# Altium integrated library ALTIUM-PHD_2_54_SMT_PIN_HEADER_6100XX18X21.IntLib: 138 symbols
Pins are listed as number, name and electrical type; pins without a type are passive.

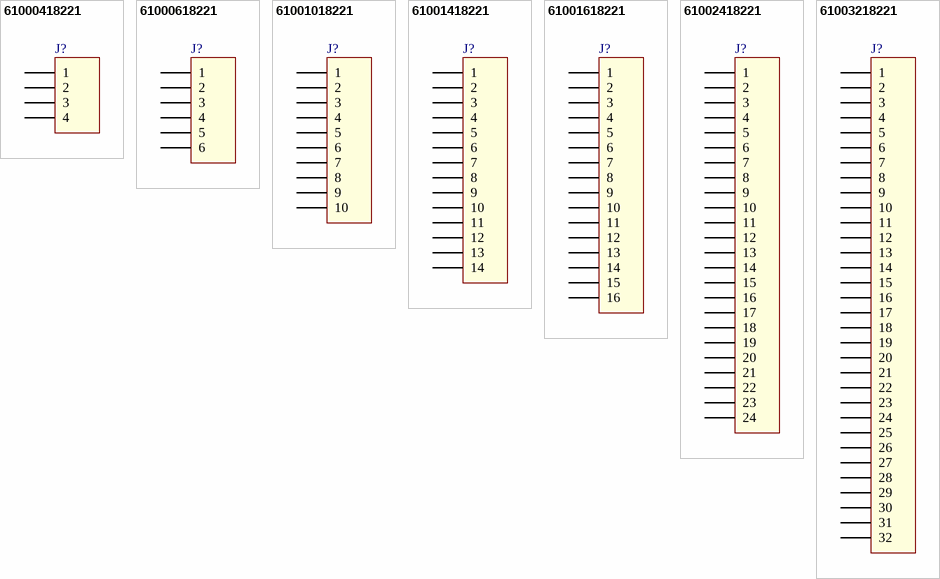
[diagram p0: symbols 61000418221 to 61003218221]

## 61000418221
designator J?
WR-PHD 2.54 mm SMT Pin Header, 4p; Part Number: 61000418221; Pin Number: 4; Rated Current: 3 A; Working Voltage: 250 VAC; Withstanding Voltage: 500 VAC; Pitch: 2.54 mm; ComponentLink1Description: Manufacturer; ComponentLink1URL: http://www.we-online.de; ComponentLink2Description: Datasheet; ComponentLink2URL: http://katalog.we-online.de/em/datasheet/6100xx18221%282%29.pdf; Published Date: Aug 2017; Publisher: Wurth Elektronik
footprint 61000418221
pins: 1, 2, 3, 4

## 61000618221
designator J?
WR-PHD 2.54 mm SMT Pin Header, 6p; Part Number: 61000618221; Pin Number: 6; Rated Current: 3 A; Working Voltage: 250 VAC; Withstanding Voltage: 500 VAC; Pitch: 2.54 mm; ComponentLink1Description: Manufacturer; ComponentLink1URL: http://www.we-online.de; ComponentLink2Description: Datasheet; ComponentLink2URL: http://katalog.we-online.de/em/datasheet/6100xx18221%282%29.pdf; Published Date: Aug 2017; Publisher: Wurth Elektronik
footprint 61000618221
pins: 1, 2, 3, 4, 5, 6

## 61001018221
designator J?
WR-PHD 2.54 mm SMT Pin Header, 10p; Part Number: 61001018221; Pin Number: 10; Rated Current: 3 A; Working Voltage: 250 VAC; Withstanding Voltage: 500 VAC; Pitch: 2.54 mm; ComponentLink1Description: Manufacturer; ComponentLink1URL: http://www.we-online.de; ComponentLink2Description: Datasheet; ComponentLink2URL: http://katalog.we-online.de/em/datasheet/6100xx18221%282%29.pdf; Published Date: Aug 2017; Publisher: Wurth Elektronik
footprint 61001018221
pins: 1, 2, 3, 4, 5, 6, 7, 8, 9, 10

## 61001418221
designator J?
WR-PHD 2.54 mm SMT Pin Header, 14p; Part Number: 61001418221; Pin Number: 14; Rated Current: 3 A; Working Voltage: 250 VAC; Withstanding Voltage: 500 VAC; Pitch: 2.54 mm; ComponentLink1Description: Manufacturer; ComponentLink1URL: http://www.we-online.de; ComponentLink2Description: Datasheet; ComponentLink2URL: http://katalog.we-online.de/em/datasheet/6100xx18221%282%29.pdf; Published Date: Aug 2017; Publisher: Wurth Elektronik
footprint 61001418221
pins: 1, 2, 3, 4, 5, 6, 7, 8, 9, 10, 11, 12, 13, 14

## 61001618221
designator J?
WR-PHD 2.54 mm SMT Pin Header, 16p; Part Number: 61001618221; Pin Number: 16; Rated Current: 3 A; Working Voltage: 250 VAC; Withstanding Voltage: 500 VAC; Pitch: 2.54 mm; ComponentLink1Description: Manufacturer; ComponentLink1URL: http://www.we-online.de; ComponentLink2Description: Datasheet; ComponentLink2URL: http://katalog.we-online.de/em/datasheet/6100xx18221%282%29.pdf; Published Date: Aug 2017; Publisher: Wurth Elektronik
footprint 61001618221
pins: 1, 2, 3, 4, 5, 6, 7, 8, 9, 10, 11, 12, 13, 14, 15, 16

## 61002418221
designator J?
WR-PHD 2.54 mm SMT Pin Header, 24p; Part Number: 61002418221; Pin Number: 24; Rated Current: 3 A; Working Voltage: 250 VAC; Withstanding Voltage: 500 VAC; Pitch: 2.54 mm; ComponentLink1Description: Manufacturer; ComponentLink1URL: http://www.we-online.de; ComponentLink2Description: Datasheet; ComponentLink2URL: http://katalog.we-online.de/em/datasheet/6100xx18221%282%29.pdf; Published Date: Aug 2017; Publisher: Wurth Elektronik
footprint 61002418221
pins: 1, 2, 3, 4, 5, 6, 7, 8, 9, 10, 11, 12, 13, 14, 15, 16, 17, 18, 19, 20, 21, 22, 23, 24

## 61003218221
designator J?
WR-PHD 2.54 mm SMT Pin Header, 32p; Part Number: 61003218221; Pin Number: 32; Rated Current: 3 A; Working Voltage: 250 VAC; Withstanding Voltage: 500 VAC; Pitch: 2.54 mm; ComponentLink1Description: Manufacturer; ComponentLink1URL: http://www.we-online.de; ComponentLink2Description: Datasheet; ComponentLink2URL: http://katalog.we-online.de/em/datasheet/6100xx18221%282%29.pdf; Published Date: Aug 2017; Publisher: Wurth Elektronik
footprint 61003218221
pins: 1, 2, 3, 4, 5, 6, 7, 8, 9, 10, 11, 12, 13, 14, 15, 16, 17, 18, 19, 20, 21, 22, 23, 24, 25, 26, 27, 28, 29, 30, 31, 32


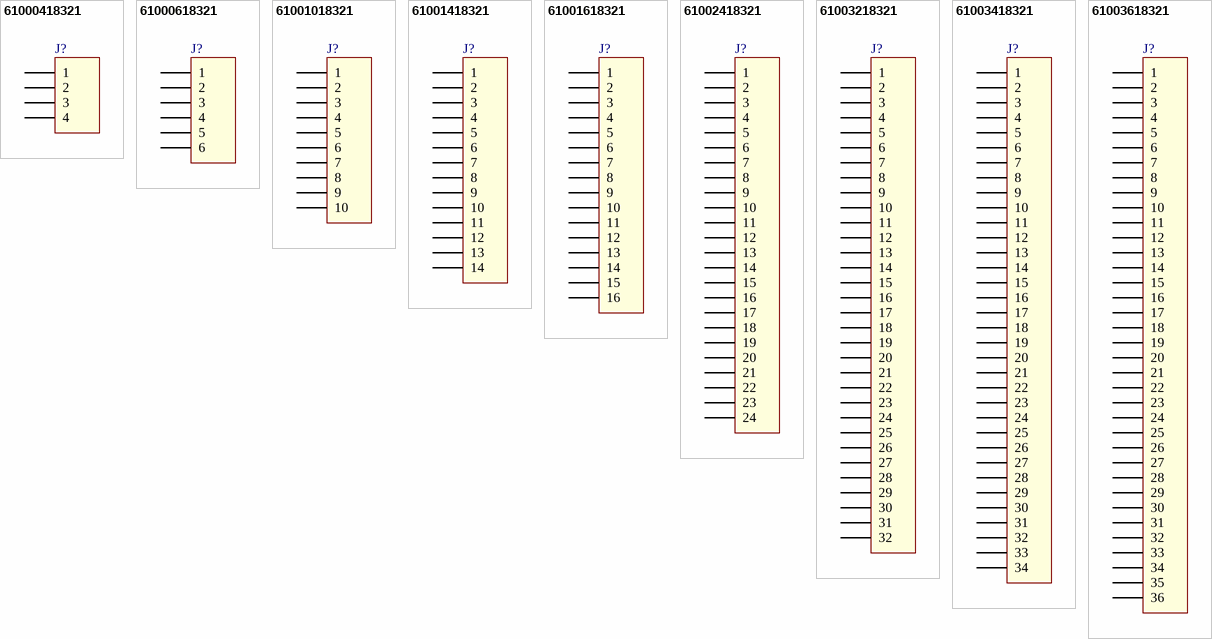
[diagram p1: symbols 61000418321 to 61003618321]

## 61000418321
designator J?
WR-PHD 2.54 mm SMT Pin Header, 4p; Part Number: 61000418321; Pin Number: 4; Rated Current: 3 A; Working Voltage: 250 VAC; Withstanding Voltage: 500 VAC; Pitch: 2.54 mm; ComponentLink1Description: Manufacturer; ComponentLink1URL: http://www.we-online.de; ComponentLink2Description: Datasheet; ComponentLink2URL: http://katalog.we-online.de/em/datasheet/6100xx18321.pdf; Published Date: Aug 2017; Publisher: Wurth Elektronik
footprint 61000418321
pins: 1, 2, 3, 4

## 61000618321
designator J?
WR-PHD 2.54 mm SMT Pin Header, 6p; Part Number: 61000618321; Pin Number: 6; Rated Current: 3 A; Working Voltage: 250 VAC; Withstanding Voltage: 500 VAC; Pitch: 2.54 mm; ComponentLink1Description: Manufacturer; ComponentLink1URL: http://www.we-online.de; ComponentLink2Description: Datasheet; ComponentLink2URL: http://katalog.we-online.de/em/datasheet/6100xx18321.pdf; Published Date: Aug 2017; Publisher: Wurth Elektronik
footprint 61000618321
pins: 1, 2, 3, 4, 5, 6

## 61001018321
designator J?
WR-PHD 2.54 mm SMT Pin Header, 10p; Part Number: 61001018321; Pin Number: 10; Rated Current: 3 A; Working Voltage: 250 VAC; Withstanding Voltage: 500 VAC; Pitch: 2.54 mm; ComponentLink1Description: Manufacturer; ComponentLink1URL: http://www.we-online.de; ComponentLink2Description: Datasheet; ComponentLink2URL: http://katalog.we-online.de/em/datasheet/6100xx18321.pdf; Published Date: Aug 2017; Publisher: Wurth Elektronik
footprint 61001018321
pins: 1, 2, 3, 4, 5, 6, 7, 8, 9, 10

## 61001418321
designator J?
WR-PHD 2.54 mm SMT Pin Header, 14p; Part Number: 61001418321; Pin Number: 14; Rated Current: 3 A; Working Voltage: 250 VAC; Withstanding Voltage: 500 VAC; Pitch: 2.54 mm; ComponentLink1Description: Manufacturer; ComponentLink1URL: http://www.we-online.de; ComponentLink2Description: Datasheet; ComponentLink2URL: http://katalog.we-online.de/em/datasheet/6100xx18321.pdf; Published Date: Aug 2017; Publisher: Wurth Elektronik
footprint 61001418321
pins: 1, 2, 3, 4, 5, 6, 7, 8, 9, 10, 11, 12, 13, 14

## 61001618321
designator J?
WR-PHD 2.54 mm SMT Pin Header, 16p; Part Number: 61001618321; Pin Number: 16; Rated Current: 3 A; Working Voltage: 250 VAC; Withstanding Voltage: 500 VAC; Pitch: 2.54 mm; ComponentLink1Description: Manufacturer; ComponentLink1URL: http://www.we-online.de; ComponentLink2Description: Datasheet; ComponentLink2URL: http://katalog.we-online.de/em/datasheet/6100xx18321.pdf; Published Date: Aug 2017; Publisher: Wurth Elektronik
footprint 61001618321
pins: 1, 2, 3, 4, 5, 6, 7, 8, 9, 10, 11, 12, 13, 14, 15, 16

## 61002418321
designator J?
WR-PHD 2.54 mm SMT Pin Header, 24p; Part Number: 61002418321; Pin Number: 24; Rated Current: 3 A; Working Voltage: 250 VAC; Withstanding Voltage: 500 VAC; Pitch: 2.54 mm; ComponentLink1Description: Manufacturer; ComponentLink1URL: http://www.we-online.de; ComponentLink2Description: Datasheet; ComponentLink2URL: http://katalog.we-online.de/em/datasheet/6100xx18321.pdf; Published Date: Aug 2017; Publisher: Wurth Elektronik
footprint 61002418321
pins: 1, 2, 3, 4, 5, 6, 7, 8, 9, 10, 11, 12, 13, 14, 15, 16, 17, 18, 19, 20, 21, 22, 23, 24

## 61003218321
designator J?
WR-PHD 2.54 mm SMT Pin Header, 32p; Part Number: 61003218321; Pin Number: 32; Rated Current: 3 A; Working Voltage: 250 VAC; Withstanding Voltage: 500 VAC; Pitch: 2.54 mm; ComponentLink1Description: Manufacturer; ComponentLink1URL: http://www.we-online.de; ComponentLink2Description: Datasheet; ComponentLink2URL: http://katalog.we-online.de/em/datasheet/6100xx18321.pdf; Published Date: Aug 2017; Publisher: Wurth Elektronik
footprint 61003218321
pins: 1, 2, 3, 4, 5, 6, 7, 8, 9, 10, 11, 12, 13, 14, 15, 16, 17, 18, 19, 20, 21, 22, 23, 24, 25, 26, 27, 28, 29, 30, 31, 32

## 61003418321
designator J?
WR-PHD 2.54 mm SMT Pin Header, 34p; Part Number: 61003418321; Pin Number: 34; Rated Current: 3 A; Working Voltage: 250 VAC; Withstanding Voltage: 500 VAC; Pitch: 2.54 mm; ComponentLink1Description: Manufacturer; ComponentLink1URL: http://www.we-online.de; ComponentLink2Description: Datasheet; ComponentLink2URL: http://katalog.we-online.de/em/datasheet/6100xx18321.pdf; Published Date: Aug 2017; Publisher: Wurth Elektronik
footprint 61003418321
pins: 1, 2, 3, 4, 5, 6, 7, 8, 9, 10, 11, 12, 13, 14, 15, 16, 17, 18, 19, 20, 21, 22, 23, 24, 25, 26, 27, 28, 29, 30, 31, 32, 33, 34

## 61003618321
designator J?
WR-PHD 2.54 mm SMT Pin Header, 36p; Part Number: 61003618321; Pin Number: 36; Rated Current: 3 A; Working Voltage: 250 VAC; Withstanding Voltage: 500 VAC; Pitch: 2.54 mm; ComponentLink1Description: Manufacturer; ComponentLink1URL: http://www.we-online.de; ComponentLink2Description: Datasheet; ComponentLink2URL: http://katalog.we-online.de/em/datasheet/6100xx18321.pdf; Published Date: Aug 2017; Publisher: Wurth Elektronik
footprint 61003618321
pins: 1, 2, 3, 4, 5, 6, 7, 8, 9, 10, 11, 12, 13, 14, 15, 16, 17, 18, 19, 20, 21, 22, 23, 24, 25, 26, 27, 28, 29, 30, 31, 32, 33, 34, 35, 36


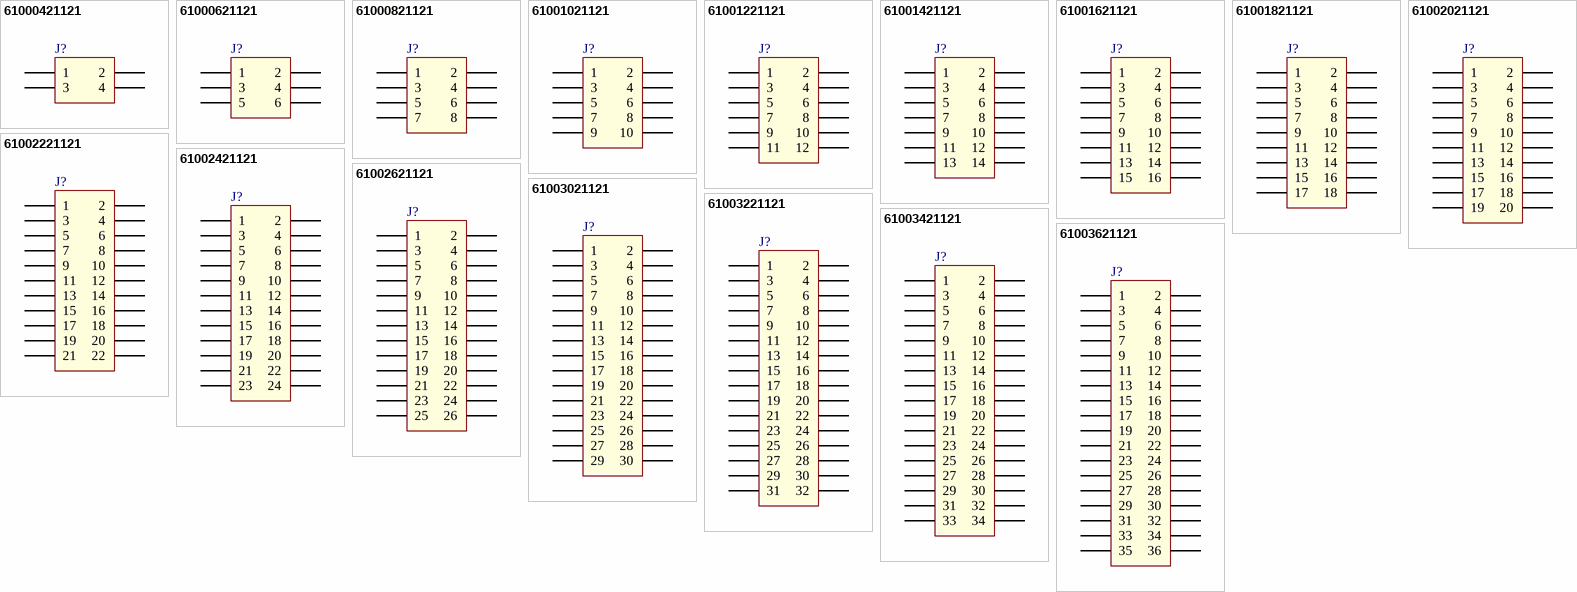
[diagram p2: symbols 61000421121 to 61003621121]

## 61000421121
designator J?
WR-PHD 2.54 mm SMT Dual Pin Header, 4p; Part Number: 61000421121; Pin Number: 4; Rated Current: 3 A; Working Voltage: 250 VAC; Withstanding Voltage: 500 VAC; Pitch: 2.54 mm; ComponentLink1Description: Manufacturer; ComponentLink1URL: http://www.we-online.de; ComponentLink2Description: Datasheet; ComponentLink2URL: http://katalog.we-online.de/em/datasheet/6100xx21121.pdf; Published Date: Aug 2017; Publisher: Wurth Elektronik
footprint 61000421121
pins: 1, 2, 3, 4

## 61000621121
designator J?
WR-PHD 2.54 mm SMT Dual Pin Header, 6p; Part Number: 61000621121; Pin Number: 6; Rated Current: 3 A; Working Voltage: 250 VAC; Withstanding Voltage: 500 VAC; Pitch: 2.54 mm; ComponentLink1Description: Manufacturer; ComponentLink1URL: http://www.we-online.de; ComponentLink2Description: Datasheet; ComponentLink2URL: http://katalog.we-online.de/em/datasheet/6100xx21121.pdf; Published Date: Aug 2017; Publisher: Wurth Elektronik
footprint 61000621121
pins: 1, 2, 3, 4, 5, 6

## 61000821121
designator J?
WR-PHD 2.54 mm SMT Dual Pin Header, 8p; Part Number: 61000821121; Pin Number: 8; Rated Current: 3 A; Working Voltage: 250 VAC; Withstanding Voltage: 500 VAC; Pitch: 2.54 mm; ComponentLink1Description: Manufacturer; ComponentLink1URL: http://www.we-online.de; ComponentLink2Description: Datasheet; ComponentLink2URL: http://katalog.we-online.de/em/datasheet/6100xx21121.pdf; Published Date: Aug 2017; Publisher: Wurth Elektronik
footprint 61000821121
pins: 1, 2, 3, 4, 5, 6, 7, 8

## 61001021121
designator J?
WR-PHD 2.54 mm SMT Dual Pin Header, 10p; Part Number: 61001021121; Pin Number: 10; Rated Current: 3 A; Working Voltage: 250 VAC; Withstanding Voltage: 500 VAC; Pitch: 2.54 mm; ComponentLink1Description: Manufacturer; ComponentLink1URL: http://www.we-online.de; ComponentLink2Description: Datasheet; ComponentLink2URL: http://katalog.we-online.de/em/datasheet/6100xx21121.pdf; Published Date: Aug 2017; Publisher: Wurth Elektronik
footprint 61001021121
pins: 1, 2, 3, 4, 5, 6, 7, 8, 9, 10

## 61001221121
designator J?
WR-PHD 2.54 mm SMT Dual Pin Header, 12p; Part Number: 61001221121; Pin Number: 12; Rated Current: 3 A; Working Voltage: 250 VAC; Withstanding Voltage: 500 VAC; Pitch: 2.54 mm; ComponentLink1Description: Manufacturer; ComponentLink1URL: http://www.we-online.de; ComponentLink2Description: Datasheet; ComponentLink2URL: http://katalog.we-online.de/em/datasheet/6100xx21121.pdf; Published Date: Aug 2017; Publisher: Wurth Elektronik
footprint 61001221121
pins: 1, 2, 3, 4, 5, 6, 7, 8, 9, 10, 11, 12

## 61001421121
designator J?
WR-PHD 2.54 mm SMT Dual Pin Header, 14p; Part Number: 61001421121; Pin Number: 14; Rated Current: 3 A; Working Voltage: 250 VAC; Withstanding Voltage: 500 VAC; Pitch: 2.54 mm; ComponentLink1Description: Manufacturer; ComponentLink1URL: http://www.we-online.de; ComponentLink2Description: Datasheet; ComponentLink2URL: http://katalog.we-online.de/em/datasheet/6100xx21121.pdf; Published Date: Aug 2017; Publisher: Wurth Elektronik
footprint 61001421121
pins: 1, 2, 3, 4, 5, 6, 7, 8, 9, 10, 11, 12, 13, 14

## 61001621121
designator J?
WR-PHD 2.54 mm SMT Dual Pin Header, 16p; Part Number: 61001621121; Pin Number: 16; Rated Current: 3 A; Working Voltage: 250 VAC; Withstanding Voltage: 500 VAC; Pitch: 2.54 mm; ComponentLink1Description: Manufacturer; ComponentLink1URL: http://www.we-online.de; ComponentLink2Description: Datasheet; ComponentLink2URL: http://katalog.we-online.de/em/datasheet/6100xx21121.pdf; Published Date: Aug 2017; Publisher: Wurth Elektronik
footprint 61001621121
pins: 1, 2, 3, 4, 5, 6, 7, 8, 9, 10, 11, 12, 13, 14, 15, 16

## 61001821121
designator J?
WR-PHD 2.54 mm SMT Dual Pin Header, 18p; Part Number: 61001821121; Pin Number: 18; Rated Current: 3 A; Working Voltage: 250 VAC; Withstanding Voltage: 500 VAC; Pitch: 2.54 mm; ComponentLink1Description: Manufacturer; ComponentLink1URL: http://www.we-online.de; ComponentLink2Description: Datasheet; ComponentLink2URL: http://katalog.we-online.de/em/datasheet/6100xx21121.pdf; Published Date: Aug 2017; Publisher: Wurth Elektronik
footprint 61001821121
pins: 1, 2, 3, 4, 5, 6, 7, 8, 9, 10, 11, 12, 13, 14, 15, 16, 17, 18

## 61002021121
designator J?
WR-PHD 2.54 mm SMT Dual Pin Header, 20p; Part Number: 61002021121; Pin Number: 20; Rated Current: 3 A; Working Voltage: 250 VAC; Withstanding Voltage: 500 VAC; Pitch: 2.54 mm; ComponentLink1Description: Manufacturer; ComponentLink1URL: http://www.we-online.de; ComponentLink2Description: Datasheet; ComponentLink2URL: http://katalog.we-online.de/em/datasheet/6100xx21121.pdf; Published Date: Aug 2017; Publisher: Wurth Elektronik
footprint 61002021121
pins: 1, 2, 3, 4, 5, 6, 7, 8, 9, 10, 11, 12, 13, 14, 15, 16, 17, 18, 19, 20

## 61002221121
designator J?
WR-PHD 2.54 mm SMT Dual Pin Header, 22p; Part Number: 61002221121; Pin Number: 22; Rated Current: 3 A; Working Voltage: 250 VAC; Withstanding Voltage: 500 VAC; Pitch: 2.54 mm; ComponentLink1Description: Manufacturer; ComponentLink1URL: http://www.we-online.de; ComponentLink2Description: Datasheet; ComponentLink2URL: http://katalog.we-online.de/em/datasheet/6100xx21121.pdf; Published Date: Aug 2017; Publisher: Wurth Elektronik
footprint 61002221121
pins: 1, 2, 3, 4, 5, 6, 7, 8, 9, 10, 11, 12, 13, 14, 15, 16, 17, 18, 19, 20, 21, 22

## 61002421121
designator J?
WR-PHD 2.54 mm SMT Dual Pin Header, 24p; Part Number: 61002421121; Pin Number: 24; Rated Current: 3 A; Working Voltage: 250 VAC; Withstanding Voltage: 500 VAC; Pitch: 2.54 mm; ComponentLink1Description: Manufacturer; ComponentLink1URL: http://www.we-online.de; ComponentLink2Description: Datasheet; ComponentLink2URL: http://katalog.we-online.de/em/datasheet/6100xx21121.pdf; Published Date: Aug 2017; Publisher: Wurth Elektronik
footprint 61002421121
pins: 1, 2, 3, 4, 5, 6, 7, 8, 9, 10, 11, 12, 13, 14, 15, 16, 17, 18, 19, 20, 21, 22, 23, 24

## 61002621121
designator J?
WR-PHD 2.54 mm SMT Dual Pin Header, 26p; Part Number: 61002621121; Pin Number: 26; Rated Current: 3 A; Working Voltage: 250 VAC; Withstanding Voltage: 500 VAC; Pitch: 2.54 mm; ComponentLink1Description: Manufacturer; ComponentLink1URL: http://www.we-online.de; ComponentLink2Description: Datasheet; ComponentLink2URL: http://katalog.we-online.de/em/datasheet/6100xx21121.pdf; Published Date: Aug 2017; Publisher: Wurth Elektronik
footprint 61002621121
pins: 1, 2, 3, 4, 5, 6, 7, 8, 9, 10, 11, 12, 13, 14, 15, 16, 17, 18, 19, 20, 21, 22, 23, 24, 25, 26

## 61003021121
designator J?
WR-PHD 2.54 mm SMT Dual Pin Header, 30p; Part Number: 61003021121; Pin Number: 30; Rated Current: 3 A; Working Voltage: 250 VAC; Withstanding Voltage: 500 VAC; Pitch: 2.54 mm; ComponentLink1Description: Manufacturer; ComponentLink1URL: http://www.we-online.de; ComponentLink2Description: Datasheet; ComponentLink2URL: http://katalog.we-online.de/em/datasheet/6100xx21121.pdf; Published Date: Aug 2017; Publisher: Wurth Elektronik
footprint 61003021121
pins: 1, 2, 3, 4, 5, 6, 7, 8, 9, 10, 11, 12, 13, 14, 15, 16, 17, 18, 19, 20, 21, 22, 23, 24, 25, 26, 27, 28, 29, 30

## 61003221121
designator J?
WR-PHD 2.54 mm SMT Dual Pin Header, 32p; Part Number: 61003221121; Pin Number: 32; Rated Current: 3 A; Working Voltage: 250 VAC; Withstanding Voltage: 500 VAC; Pitch: 2.54 mm; ComponentLink1Description: Manufacturer; ComponentLink1URL: http://www.we-online.de; ComponentLink2Description: Datasheet; ComponentLink2URL: http://katalog.we-online.de/em/datasheet/6100xx21121.pdf; Published Date: Aug 2017; Publisher: Wurth Elektronik
footprint 61003221121
pins: 1, 2, 3, 4, 5, 6, 7, 8, 9, 10, 11, 12, 13, 14, 15, 16, 17, 18, 19, 20, 21, 22, 23, 24, 25, 26, 27, 28, 29, 30, 31, 32

## 61003421121
designator J?
WR-PHD 2.54 mm SMT Dual Pin Header, 34p; Part Number: 61003421121; Pin Number: 34; Rated Current: 3 A; Working Voltage: 250 VAC; Withstanding Voltage: 500 VAC; Pitch: 2.54 mm; ComponentLink1Description: Manufacturer; ComponentLink1URL: http://www.we-online.de; ComponentLink2Description: Datasheet; ComponentLink2URL: http://katalog.we-online.de/em/datasheet/6100xx21121.pdf; Published Date: Aug 2017; Publisher: Wurth Elektronik
footprint 61003421121
pins: 1, 2, 3, 4, 5, 6, 7, 8, 9, 10, 11, 12, 13, 14, 15, 16, 17, 18, 19, 20, 21, 22, 23, 24, 25, 26, 27, 28, 29, 30, 31, 32, 33, 34

## 61003621121
designator J?
WR-PHD 2.54 mm SMT Dual Pin Header, 36p; Part Number: 61003621121; Pin Number: 36; Rated Current: 3 A; Working Voltage: 250 VAC; Withstanding Voltage: 500 VAC; Pitch: 2.54 mm; ComponentLink1Description: Manufacturer; ComponentLink1URL: http://www.we-online.de; ComponentLink2Description: Datasheet; ComponentLink2URL: http://katalog.we-online.de/em/datasheet/6100xx21121.pdf; Published Date: Aug 2017; Publisher: Wurth Elektronik
footprint 61003621121
pins: 1, 2, 3, 4, 5, 6, 7, 8, 9, 10, 11, 12, 13, 14, 15, 16, 17, 18, 19, 20, 21, 22, 23, 24, 25, 26, 27, 28, 29, 30, 31, 32, 33, 34, 35, 36


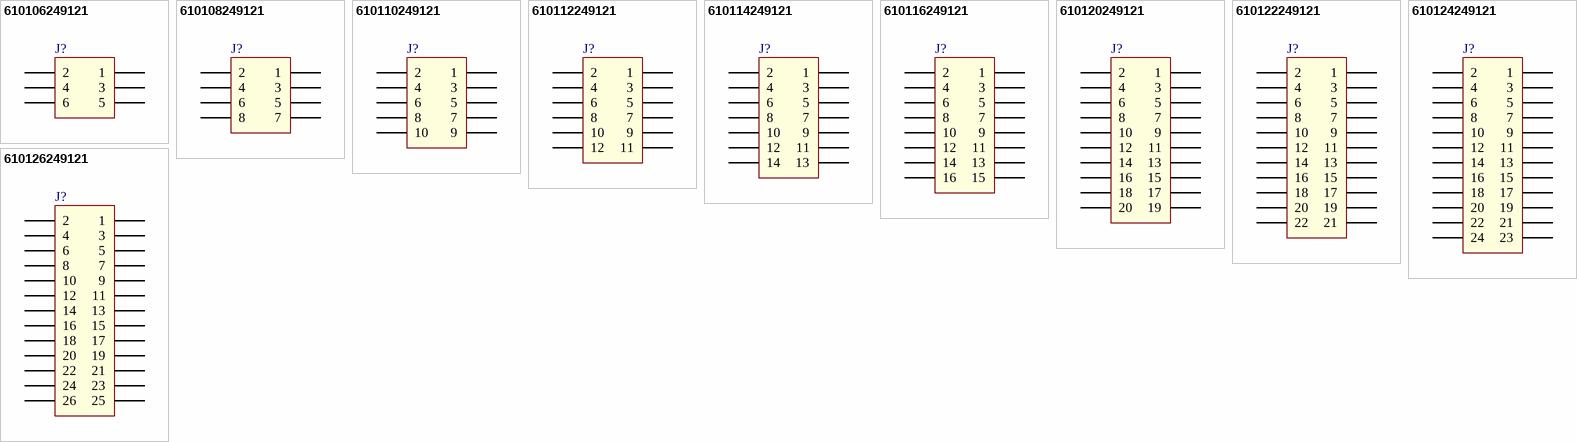
[diagram p3: symbols 610106249121 to 610126249121]

## 610106249121
designator J?
WR-PHD 2.54 mm SMT Angled Dual Pin Header, 6p; Part Number: 610106249121; Pin Number: 6; Rated Current: 3 A; Working Voltage: 250 VAC; Withstanding Voltage: 600 VAC; Pitch: 2.54 mm; ComponentLink1Description: Manufacturer; ComponentLink1URL: http://www.we-online.de; ComponentLink2Description: Datasheet; ComponentLink2URL: http://katalog.we-online.de/em/datasheet/6101xx249121.pdf; Published Date: Aug 2017; Publisher: Wurth Elektronik
footprint 610106249121
pins: 1, 2, 3, 4, 5, 6

## 610108249121
designator J?
WR-PHD 2.54 mm SMT Angled Dual Pin Header, 8p; Part Number: 610108249121; Pin Number: 8; Rated Current: 3 A; Working Voltage: 250 VAC; Withstanding Voltage: 600 VAC; Pitch: 2.54 mm; ComponentLink1Description: Manufacturer; ComponentLink1URL: http://www.we-online.de; ComponentLink2Description: Datasheet; ComponentLink2URL: http://katalog.we-online.de/em/datasheet/6101xx249121.pdf; Published Date: Aug 2017; Publisher: Wurth Elektronik
footprint 610108249121
pins: 1, 2, 3, 4, 5, 6, 7, 8

## 610110249121
designator J?
WR-PHD 2.54 mm SMT Angled Dual Pin Header, 10p; Part Number: 610110249121; Pin Number: 10; Rated Current: 3 A; Working Voltage: 250 VAC; Withstanding Voltage: 600 VAC; Pitch: 2.54 mm; ComponentLink1Description: Manufacturer; ComponentLink1URL: http://www.we-online.de; ComponentLink2Description: Datasheet; ComponentLink2URL: http://katalog.we-online.de/em/datasheet/6101xx249121.pdf; Published Date: Aug 2017; Publisher: Wurth Elektronik
footprint 610110249121
pins: 1, 2, 3, 4, 5, 6, 7, 8, 9, 10

## 610112249121
designator J?
WR-PHD 2.54 mm SMT Angled Dual Pin Header, 12p; Part Number: 610112249121; Pin Number: 12; Rated Current: 3 A; Working Voltage: 250 VAC; Withstanding Voltage: 600 VAC; Pitch: 2.54 mm; ComponentLink1Description: Manufacturer; ComponentLink1URL: http://www.we-online.de; ComponentLink2Description: Datasheet; ComponentLink2URL: http://katalog.we-online.de/em/datasheet/6101xx249121.pdf; Published Date: Aug 2017; Publisher: Wurth Elektronik
footprint 610112249121
pins: 1, 2, 3, 4, 5, 6, 7, 8, 9, 10, 11, 12

## 610114249121
designator J?
WR-PHD 2.54 mm SMT Angled Dual Pin Header, 14p; Part Number: 610114249121; Pin Number: 14; Rated Current: 3 A; Working Voltage: 250 VAC; Withstanding Voltage: 600 VAC; Pitch: 2.54 mm; ComponentLink1Description: Manufacturer; ComponentLink1URL: http://www.we-online.de; ComponentLink2Description: Datasheet; ComponentLink2URL: http://katalog.we-online.de/em/datasheet/6101xx249121.pdf; Published Date: Aug 2017; Publisher: Wurth Elektronik
footprint 610114249121
pins: 1, 2, 3, 4, 5, 6, 7, 8, 9, 10, 11, 12, 13, 14

## 610116249121
designator J?
WR-PHD 2.54 mm SMT Angled Dual Pin Header, 16p; Part Number: 610116249121; Pin Number: 16; Rated Current: 3 A; Working Voltage: 250 VAC; Withstanding Voltage: 600 VAC; Pitch: 2.54 mm; ComponentLink1Description: Manufacturer; ComponentLink1URL: http://www.we-online.de; ComponentLink2Description: Datasheet; ComponentLink2URL: http://katalog.we-online.de/em/datasheet/6101xx249121.pdf; Published Date: Aug 2017; Publisher: Wurth Elektronik
footprint 610116249121
pins: 1, 2, 3, 4, 5, 6, 7, 8, 9, 10, 11, 12, 13, 14, 15, 16

## 610120249121
designator J?
WR-PHD 2.54 mm SMT Angled Dual Pin Header, 20p; Part Number: 610120249121; Pin Number: 20; Rated Current: 3 A; Working Voltage: 250 VAC; Withstanding Voltage: 600 VAC; Pitch: 2.54 mm; ComponentLink1Description: Manufacturer; ComponentLink1URL: http://www.we-online.de; ComponentLink2Description: Datasheet; ComponentLink2URL: http://katalog.we-online.de/em/datasheet/6101xx249121.pdf; Published Date: Aug 2017; Publisher: Wurth Elektronik
footprint 610120249121
pins: 1, 2, 3, 4, 5, 6, 7, 8, 9, 10, 11, 12, 13, 14, 15, 16, 17, 18, 19, 20

## 610122249121
designator J?
WR-PHD 2.54 mm SMT Angled Dual Pin Header, 22p; Part Number: 610122249121; Pin Number: 22; Rated Current: 3 A; Working Voltage: 250 VAC; Withstanding Voltage: 600 VAC; Pitch: 2.54 mm; ComponentLink1Description: Manufacturer; ComponentLink1URL: http://www.we-online.de; ComponentLink2Description: Datasheet; ComponentLink2URL: http://katalog.we-online.de/em/datasheet/6101xx249121.pdf; Published Date: Aug 2017; Publisher: Wurth Elektronik
footprint 610122249121
pins: 1, 2, 3, 4, 5, 6, 7, 8, 9, 10, 11, 12, 13, 14, 15, 16, 17, 18, 19, 20, 21, 22

## 610124249121
designator J?
WR-PHD 2.54 mm SMT Angled Dual Pin Header, 24p; Part Number: 610124249121; Pin Number: 24; Rated Current: 3 A; Working Voltage: 250 VAC; Withstanding Voltage: 600 VAC; Pitch: 2.54 mm; ComponentLink1Description: Manufacturer; ComponentLink1URL: http://www.we-online.de; ComponentLink2Description: Datasheet; ComponentLink2URL: http://katalog.we-online.de/em/datasheet/6101xx249121.pdf; Published Date: Aug 2017; Publisher: Wurth Elektronik
footprint 610124249121
pins: 1, 2, 3, 4, 5, 6, 7, 8, 9, 10, 11, 12, 13, 14, 15, 16, 17, 18, 19, 20, 21, 22, 23, 24

## 610126249121
designator J?
WR-PHD 2.54 mm SMT Angled Dual Pin Header, 26p; Part Number: 610126249121; Pin Number: 26; Rated Current: 3 A; Working Voltage: 250 VAC; Withstanding Voltage: 600 VAC; Pitch: 2.54 mm; ComponentLink1Description: Manufacturer; ComponentLink1URL: http://www.we-online.de; ComponentLink2Description: Datasheet; ComponentLink2URL: http://katalog.we-online.de/em/datasheet/6101xx249121.pdf; Published Date: Aug 2017; Publisher: Wurth Elektronik
footprint 610126249121
pins: 1, 2, 3, 4, 5, 6, 7, 8, 9, 10, 11, 12, 13, 14, 15, 16, 17, 18, 19, 20, 21, 22, 23, 24, 25, 26


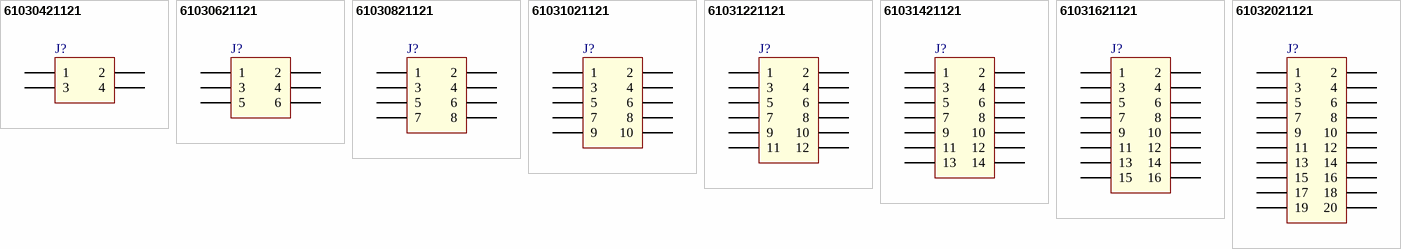
[diagram p4: symbols 61030421121 to 61032021121]

## 61030421121
designator J?
WR-PHD 2.54 mm SMT Dual Pin Header, 4p; Part Number: 61030421121; Pin Number: 4; Rated Current: 3 A; Working Voltage: 250 VAC; Withstanding Voltage: 500 VAC; Pitch: 2.54 mm; ComponentLink1Description: Manufacturer; ComponentLink1URL: http://www.we-online.de; ComponentLink2Description: Datasheet; ComponentLink2URL: http://katalog.we-online.de/em/datasheet/6103xx21121.pdf; Published Date: Aug 2017; Publisher: Wurth Elektronik
footprint 61030421121
pins: 1, 2, 3, 4

## 61030621121
designator J?
WR-PHD 2.54 mm SMT Dual Pin Header, 6p; Part Number: 61030621121; Pin Number: 6; Rated Current: 3 A; Working Voltage: 250 VAC; Withstanding Voltage: 500 VAC; Pitch: 2.54 mm; ComponentLink1Description: Manufacturer; ComponentLink1URL: http://www.we-online.de; ComponentLink2Description: Datasheet; ComponentLink2URL: http://katalog.we-online.de/em/datasheet/6103xx21121.pdf; Published Date: Aug 2017; Publisher: Wurth Elektronik
footprint 61030621121
pins: 1, 2, 3, 4, 5, 6

## 61030821121
designator J?
WR-PHD 2.54 mm SMT Dual Pin Header, 8p; Part Number: 61030821121; Pin Number: 8; Rated Current: 3 A; Working Voltage: 250 VAC; Withstanding Voltage: 500 VAC; Pitch: 2.54 mm; ComponentLink1Description: Manufacturer; ComponentLink1URL: http://www.we-online.de; ComponentLink2Description: Datasheet; ComponentLink2URL: http://katalog.we-online.de/em/datasheet/6103xx21121.pdf; Published Date: Aug 2017; Publisher: Wurth Elektronik
footprint 61030821121
pins: 1, 2, 3, 4, 5, 6, 7, 8

## 61031021121
designator J?
WR-PHD 2.54 mm SMT Dual Pin Header, 10p; Part Number: 61031021121; Pin Number: 10; Rated Current: 3 A; Working Voltage: 250 VAC; Withstanding Voltage: 500 VAC; Pitch: 2.54 mm; ComponentLink1Description: Manufacturer; ComponentLink1URL: http://www.we-online.de; ComponentLink2Description: Datasheet; ComponentLink2URL: http://katalog.we-online.de/em/datasheet/6103xx21121.pdf; Published Date: Aug 2017; Publisher: Wurth Elektronik
footprint 61031021121
pins: 1, 2, 3, 4, 5, 6, 7, 8, 9, 10

## 61031221121
designator J?
WR-PHD 2.54 mm SMT Dual Pin Header, 12p; Part Number: 61031221121; Pin Number: 12; Rated Current: 3 A; Working Voltage: 250 VAC; Withstanding Voltage: 500 VAC; Pitch: 2.54 mm; ComponentLink1Description: Manufacturer; ComponentLink1URL: http://www.we-online.de; ComponentLink2Description: Datasheet; ComponentLink2URL: http://katalog.we-online.de/em/datasheet/6103xx21121.pdf; Published Date: Aug 2017; Publisher: Wurth Elektronik
footprint 61031221121
pins: 1, 2, 3, 4, 5, 6, 7, 8, 9, 10, 11, 12

## 61031421121
designator J?
WR-PHD 2.54 mm SMT Dual Pin Header, 14p; Part Number: 61031421121; Pin Number: 14; Rated Current: 3 A; Working Voltage: 250 VAC; Withstanding Voltage: 500 VAC; Pitch: 2.54 mm; ComponentLink1Description: Manufacturer; ComponentLink1URL: http://www.we-online.de; ComponentLink2Description: Datasheet; ComponentLink2URL: http://katalog.we-online.de/em/datasheet/6103xx21121.pdf; Published Date: Aug 2017; Publisher: Wurth Elektronik
footprint 61031421121
pins: 1, 2, 3, 4, 5, 6, 7, 8, 9, 10, 11, 12, 13, 14

## 61031621121
designator J?
WR-PHD 2.54 mm SMT Dual Pin Header, 16p; Part Number: 61031621121; Pin Number: 16; Rated Current: 3 A; Working Voltage: 250 VAC; Withstanding Voltage: 500 VAC; Pitch: 2.54 mm; ComponentLink1Description: Manufacturer; ComponentLink1URL: http://www.we-online.de; ComponentLink2Description: Datasheet; ComponentLink2URL: http://katalog.we-online.de/em/datasheet/6103xx21121.pdf; Published Date: Aug 2017; Publisher: Wurth Elektronik
footprint 61031621121
pins: 1, 2, 3, 4, 5, 6, 7, 8, 9, 10, 11, 12, 13, 14, 15, 16

## 61032021121
designator J?
WR-PHD 2.54 mm SMT Dual Pin Header, 20p; Part Number: 61032021121; Pin Number: 20; Rated Current: 3 A; Working Voltage: 250 VAC; Withstanding Voltage: 500 VAC; Pitch: 2.54 mm; ComponentLink1Description: Manufacturer; ComponentLink1URL: http://www.we-online.de; ComponentLink2Description: Datasheet; ComponentLink2URL: http://katalog.we-online.de/em/datasheet/6103xx21121.pdf; Published Date: Aug 2017; Publisher: Wurth Elektronik
footprint 61032021121
pins: 1, 2, 3, 4, 5, 6, 7, 8, 9, 10, 11, 12, 13, 14, 15, 16, 17, 18, 19, 20


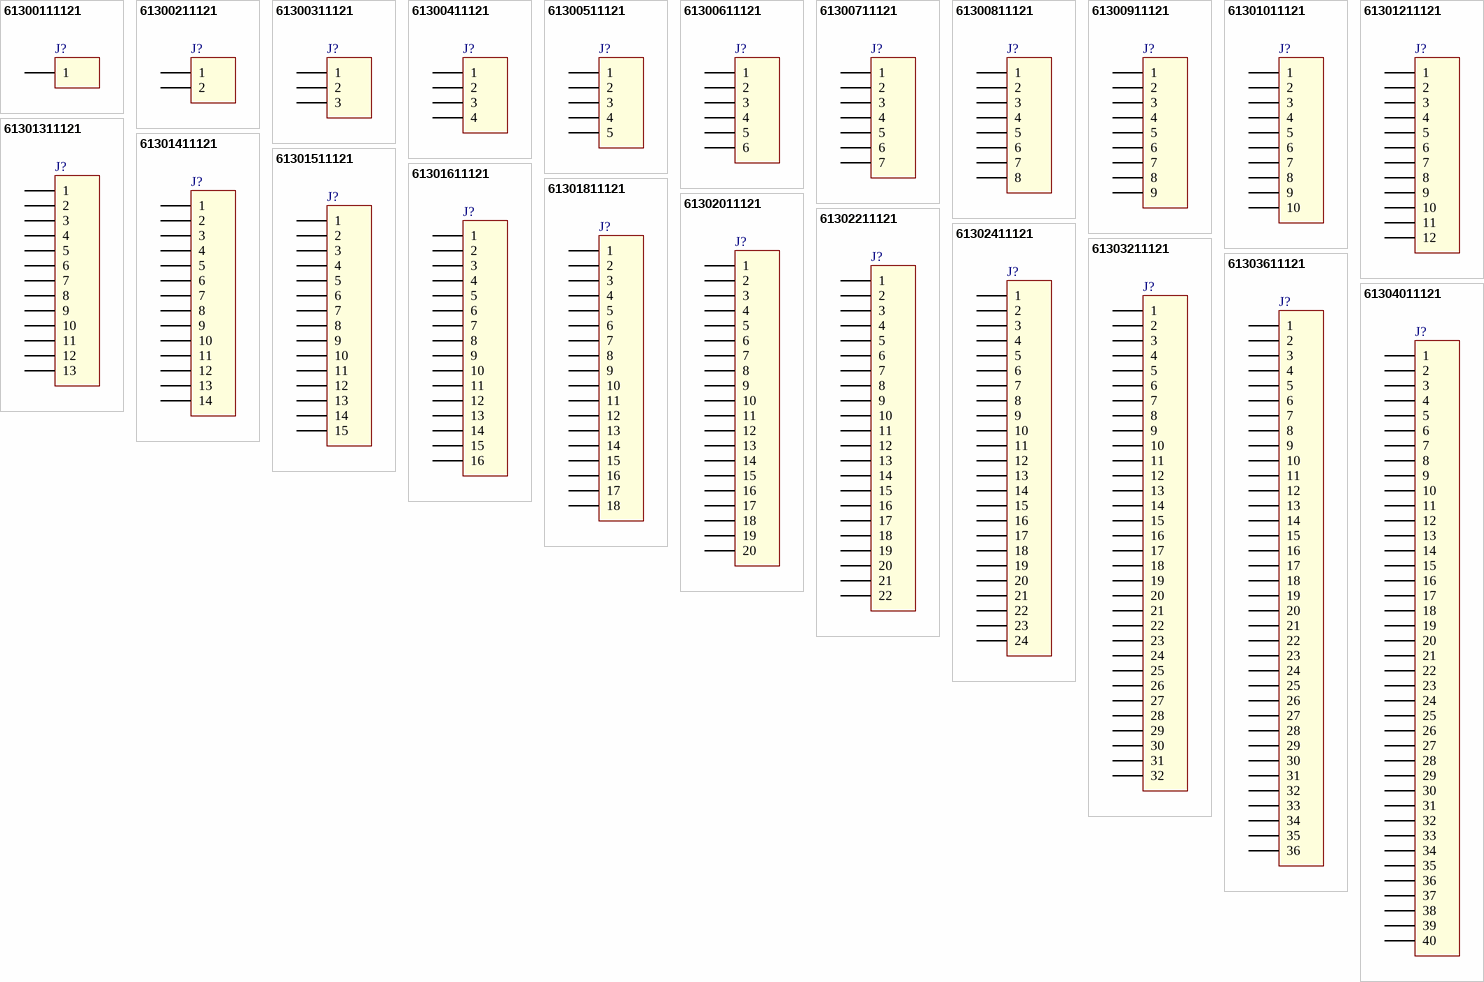
[diagram p5: symbols 61300111121 to 61304011121]

## 61300111121
designator J?
WR-PHD 2.54 mm THT Pin Header, 1p; Part Number: 61300111121; Pin Number: 1; Rated Current: 3 A; Working Voltage: 250 VAC; Withstanding Voltage: 500 VAC; Pitch: 2.54 mm; ComponentLink1Description: Manufacturer; ComponentLink1URL: http://www.we-online.de; ComponentLink2Description: Datasheet; ComponentLink2URL: http://katalog.we-online.de/em/datasheet/6130xx11121.pdf; Published Date: Aug 2017; Publisher: Wurth Elektronik
footprint 61300111121
pins: 1

## 61300211121
designator J?
WR-PHD 2.54 mm THT Pin Header, 2p; Part Number: 61300211121; Pin Number: 2; Rated Current: 3 A; Working Voltage: 250 VAC; Withstanding Voltage: 500 VAC; Pitch: 2.54 mm; ComponentLink1Description: Manufacturer; ComponentLink1URL: http://www.we-online.de; ComponentLink2Description: Datasheet; ComponentLink2URL: http://katalog.we-online.de/em/datasheet/6130xx11121.pdf; Published Date: Aug 2017; Publisher: Wurth Elektronik
footprint 61300211121
pins: 1, 2

## 61300311121
designator J?
WR-PHD 2.54 mm THT Pin Header, 3p; Part Number: 61300311121; Pin Number: 3; Rated Current: 3 A; Working Voltage: 250 VAC; Withstanding Voltage: 500 VAC; Pitch: 2.54 mm; ComponentLink1Description: Manufacturer; ComponentLink1URL: http://www.we-online.de; ComponentLink2Description: Datasheet; ComponentLink2URL: http://katalog.we-online.de/em/datasheet/6130xx11121.pdf; Published Date: Aug 2017; Publisher: Wurth Elektronik
footprint 61300311121
pins: 1, 2, 3

## 61300411121
designator J?
WR-PHD 2.54 mm THT Pin Header, 4p; Part Number: 61300411121; Pin Number: 4; Rated Current: 3 A; Working Voltage: 250 VAC; Withstanding Voltage: 500 VAC; Pitch: 2.54 mm; ComponentLink1Description: Manufacturer; ComponentLink1URL: http://www.we-online.de; ComponentLink2Description: Datasheet; ComponentLink2URL: http://katalog.we-online.de/em/datasheet/6130xx11121.pdf; Published Date: Aug 2017; Publisher: Wurth Elektronik
footprint 61300411121
pins: 1, 2, 3, 4

## 61300511121
designator J?
WR-PHD 2.54 mm THT Pin Header, 5p; Part Number: 61300511121; Pin Number: 5; Rated Current: 3 A; Working Voltage: 250 VAC; Withstanding Voltage: 500 VAC; Pitch: 2.54 mm; ComponentLink1Description: Manufacturer; ComponentLink1URL: http://www.we-online.de; ComponentLink2Description: Datasheet; ComponentLink2URL: http://katalog.we-online.de/em/datasheet/6130xx11121.pdf; Published Date: Aug 2017; Publisher: Wurth Elektronik
footprint 61300511121
pins: 1, 2, 3, 4, 5

## 61300611121
designator J?
WR-PHD 2.54 mm THT Pin Header, 6p; Part Number: 61300611121; Pin Number: 6; Rated Current: 3 A; Working Voltage: 250 VAC; Withstanding Voltage: 500 VAC; Pitch: 2.54 mm; ComponentLink1Description: Manufacturer; ComponentLink1URL: http://www.we-online.de; ComponentLink2Description: Datasheet; ComponentLink2URL: http://katalog.we-online.de/em/datasheet/6130xx11121.pdf; Published Date: Aug 2017; Publisher: Wurth Elektronik
footprint 61300611121
pins: 1, 2, 3, 4, 5, 6

## 61300711121
designator J?
WR-PHD 2.54 mm THT Pin Header, 7p; Part Number: 61300711121; Pin Number: 7; Rated Current: 3 A; Working Voltage: 250 VAC; Withstanding Voltage: 500 VAC; Pitch: 2.54 mm; ComponentLink1Description: Manufacturer; ComponentLink1URL: http://www.we-online.de; ComponentLink2Description: Datasheet; ComponentLink2URL: http://katalog.we-online.de/em/datasheet/6130xx11121.pdf; Published Date: Aug 2017; Publisher: Wurth Elektronik
footprint 61300711121
pins: 1, 2, 3, 4, 5, 6, 7

## 61300811121
designator J?
WR-PHD 2.54 mm THT Pin Header, 8p; Part Number: 61300811121; Pin Number: 8; Rated Current: 3 A; Working Voltage: 250 VAC; Withstanding Voltage: 500 VAC; Pitch: 2.54 mm; ComponentLink1Description: Manufacturer; ComponentLink1URL: http://www.we-online.de; ComponentLink2Description: Datasheet; ComponentLink2URL: http://katalog.we-online.de/em/datasheet/6130xx11121.pdf; Published Date: Aug 2017; Publisher: Wurth Elektronik
footprint 61300811121
pins: 1, 2, 3, 4, 5, 6, 7, 8

## 61300911121
designator J?
WR-PHD 2.54 mm THT Pin Header, 9p; Part Number: 61300911121; Pin Number: 9; Rated Current: 3 A; Working Voltage: 250 VAC; Withstanding Voltage: 500 VAC; Pitch: 2.54 mm; ComponentLink1Description: Manufacturer; ComponentLink1URL: http://www.we-online.de; ComponentLink2Description: Datasheet; ComponentLink2URL: http://katalog.we-online.de/em/datasheet/6130xx11121.pdf; Published Date: Aug 2017; Publisher: Wurth Elektronik
footprint 61300911121
pins: 1, 2, 3, 4, 5, 6, 7, 8, 9

## 61301011121
designator J?
WR-PHD 2.54 mm THT Pin Header, 10p; Part Number: 61301011121; Pin Number: 10; Rated Current: 3 A; Working Voltage: 250 VAC; Withstanding Voltage: 500 VAC; Pitch: 2.54 mm; ComponentLink1Description: Manufacturer; ComponentLink1URL: http://www.we-online.de; ComponentLink2Description: Datasheet; ComponentLink2URL: http://katalog.we-online.de/em/datasheet/6130xx11121.pdf; Published Date: Aug 2017; Publisher: Wurth Elektronik
footprint 61301011121
pins: 1, 2, 3, 4, 5, 6, 7, 8, 9, 10

## 61301211121
designator J?
WR-PHD 2.54 mm THT Pin Header, 12p; Part Number: 61301211121; Pin Number: 12; Rated Current: 3 A; Working Voltage: 250 VAC; Withstanding Voltage: 500 VAC; Pitch: 2.54 mm; ComponentLink1Description: Manufacturer; ComponentLink1URL: http://www.we-online.de; ComponentLink2Description: Datasheet; ComponentLink2URL: http://katalog.we-online.de/em/datasheet/6130xx11121.pdf; Published Date: Aug 2017; Publisher: Wurth Elektronik
footprint 61301211121
pins: 1, 2, 3, 4, 5, 6, 7, 8, 9, 10, 11, 12

## 61301311121
designator J?
WR-PHD 2.54 mm THT Pin Header, 13p; Part Number: 61301311121; Pin Number: 13; Rated Current: 3 A; Working Voltage: 250 VAC; Withstanding Voltage: 500 VAC; Pitch: 2.54 mm; ComponentLink1Description: Manufacturer; ComponentLink1URL: http://www.we-online.de; ComponentLink2Description: Datasheet; ComponentLink2URL: http://katalog.we-online.de/em/datasheet/6130xx11121.pdf; Published Date: Aug 2017; Publisher: Wurth Elektronik
footprint 61301311121
pins: 1, 2, 3, 4, 5, 6, 7, 8, 9, 10, 11, 12, 13

## 61301411121
designator J?
WR-PHD 2.54 mm THT Pin Header, 14p; Part Number: 61301411121; Pin Number: 14; Rated Current: 3 A; Working Voltage: 250 VAC; Withstanding Voltage: 500 VAC; Pitch: 2.54 mm; ComponentLink1Description: Manufacturer; ComponentLink1URL: http://www.we-online.de; ComponentLink2Description: Datasheet; ComponentLink2URL: http://katalog.we-online.de/em/datasheet/6130xx11121.pdf; Published Date: Aug 2017; Publisher: Wurth Elektronik
footprint 61301411121
pins: 1, 2, 3, 4, 5, 6, 7, 8, 9, 10, 11, 12, 13, 14

## 61301511121
designator J?
WR-PHD 2.54 mm THT Pin Header, 15p; Part Number: 61301511121; Pin Number: 15; Rated Current: 3 A; Working Voltage: 250 VAC; Withstanding Voltage: 500 VAC; Pitch: 2.54 mm; ComponentLink1Description: Manufacturer; ComponentLink1URL: http://www.we-online.de; ComponentLink2Description: Datasheet; ComponentLink2URL: http://katalog.we-online.de/em/datasheet/6130xx11121.pdf; Published Date: Aug 2017; Publisher: Wurth Elektronik
footprint 61301511121
pins: 1, 2, 3, 4, 5, 6, 7, 8, 9, 10, 11, 12, 13, 14, 15

## 61301611121
designator J?
WR-PHD 2.54 mm THT Pin Header, 16p; Part Number: 61301611121; Pin Number: 16; Rated Current: 3 A; Working Voltage: 250 VAC; Withstanding Voltage: 500 VAC; Pitch: 2.54 mm; ComponentLink1Description: Manufacturer; ComponentLink1URL: http://www.we-online.de; ComponentLink2Description: Datasheet; ComponentLink2URL: http://katalog.we-online.de/em/datasheet/6130xx11121.pdf; Published Date: Aug 2017; Publisher: Wurth Elektronik
footprint 61301611121
pins: 1, 2, 3, 4, 5, 6, 7, 8, 9, 10, 11, 12, 13, 14, 15, 16

## 61301811121
designator J?
WR-PHD 2.54 mm THT Pin Header, 18p; Part Number: 61301811121; Pin Number: 18; Rated Current: 3 A; Working Voltage: 250 VAC; Withstanding Voltage: 500 VAC; Pitch: 2.54 mm; ComponentLink1Description: Manufacturer; ComponentLink1URL: http://www.we-online.de; ComponentLink2Description: Datasheet; ComponentLink2URL: http://katalog.we-online.de/em/datasheet/6130xx11121.pdf; Published Date: Aug 2017; Publisher: Wurth Elektronik
footprint 61301811121
pins: 1, 2, 3, 4, 5, 6, 7, 8, 9, 10, 11, 12, 13, 14, 15, 16, 17, 18

## 61302011121
designator J?
WR-PHD 2.54 mm THT Pin Header, 20p; Part Number: 61302011121; Pin Number: 20; Rated Current: 3 A; Working Voltage: 250 VAC; Withstanding Voltage: 500 VAC; Pitch: 2.54 mm; ComponentLink1Description: Manufacturer; ComponentLink1URL: http://www.we-online.de; ComponentLink2Description: Datasheet; ComponentLink2URL: http://katalog.we-online.de/em/datasheet/6130xx11121.pdf; Published Date: Aug 2017; Publisher: Wurth Elektronik
footprint 61302011121
pins: 1, 2, 3, 4, 5, 6, 7, 8, 9, 10, 11, 12, 13, 14, 15, 16, 17, 18, 19, 20

## 61302211121
designator J?
WR-PHD 2.54 mm THT Pin Header, 22p; Part Number: 61302211121; Pin Number: 22; Rated Current: 3 A; Working Voltage: 250 VAC; Withstanding Voltage: 500 VAC; Pitch: 2.54 mm; ComponentLink1Description: Manufacturer; ComponentLink1URL: http://www.we-online.de; ComponentLink2Description: Datasheet; ComponentLink2URL: http://katalog.we-online.de/em/datasheet/6130xx11121.pdf; Published Date: Aug 2017; Publisher: Wurth Elektronik
footprint 61302211121
pins: 1, 2, 3, 4, 5, 6, 7, 8, 9, 10, 11, 12, 13, 14, 15, 16, 17, 18, 19, 20, 21, 22

## 61302411121
designator J?
WR-PHD 2.54 mm THT Pin Header, 24p; Part Number: 61302411121; Pin Number: 24; Rated Current: 3 A; Working Voltage: 250 VAC; Withstanding Voltage: 500 VAC; Pitch: 2.54 mm; ComponentLink1Description: Manufacturer; ComponentLink1URL: http://www.we-online.de; ComponentLink2Description: Datasheet; ComponentLink2URL: http://katalog.we-online.de/em/datasheet/6130xx11121.pdf; Published Date: Aug 2017; Publisher: Wurth Elektronik
footprint 61302411121
pins: 1, 2, 3, 4, 5, 6, 7, 8, 9, 10, 11, 12, 13, 14, 15, 16, 17, 18, 19, 20, 21, 22, 23, 24

## 61303211121
designator J?
WR-PHD 2.54 mm THT Pin Header, 32p; Part Number: 61303211121; Pin Number: 32; Rated Current: 3 A; Working Voltage: 250 VAC; Withstanding Voltage: 500 VAC; Pitch: 2.54 mm; ComponentLink1Description: Manufacturer; ComponentLink1URL: http://www.we-online.de; ComponentLink2Description: Datasheet; ComponentLink2URL: http://katalog.we-online.de/em/datasheet/6130xx11121.pdf; Published Date: Aug 2017; Publisher: Wurth Elektronik
footprint 61303211121
pins: 1, 2, 3, 4, 5, 6, 7, 8, 9, 10, 11, 12, 13, 14, 15, 16, 17, 18, 19, 20, 21, 22, 23, 24, 25, 26, 27, 28, 29, 30, 31, 32

## 61303611121
designator J?
WR-PHD 2.54 mm THT Pin Header, 36p; Part Number: 61303611121; Pin Number: 36; Rated Current: 3 A; Working Voltage: 250 VAC; Withstanding Voltage: 500 VAC; Pitch: 2.54 mm; ComponentLink1Description: Manufacturer; ComponentLink1URL: http://www.we-online.de; ComponentLink2Description: Datasheet; ComponentLink2URL: http://katalog.we-online.de/em/datasheet/6130xx11121.pdf; Published Date: Aug 2017; Publisher: Wurth Elektronik
footprint 61303611121
pins: 1, 2, 3, 4, 5, 6, 7, 8, 9, 10, 11, 12, 13, 14, 15, 16, 17, 18, 19, 20, 21, 22, 23, 24, 25, 26, 27, 28, 29, 30, 31, 32, 33, 34, 35, 36

## 61304011121
designator J?
WR-PHD 2.54 mm THT Pin Header, 40p; Part Number: 61304011121; Pin Number: 40; Rated Current: 3 A; Working Voltage: 250 VAC; Withstanding Voltage: 500 VAC; Pitch: 2.54 mm; ComponentLink1Description: Manufacturer; ComponentLink1URL: http://www.we-online.de; ComponentLink2Description: Datasheet; ComponentLink2URL: http://katalog.we-online.de/em/datasheet/6130xx11121.pdf; Published Date: Aug 2017; Publisher: Wurth Elektronik
footprint 61304011121
pins: 1, 2, 3, 4, 5, 6, 7, 8, 9, 10, 11, 12, 13, 14, 15, 16, 17, 18, 19, 20, 21, 22, 23, 24, 25, 26, 27, 28, 29, 30, 31, 32, 33, 34, 35, 36, 37, 38, 39, 40

